# Altium footprint library 接插件.PcbLib: 88 footprints (part 1 of 6)
Each footprint in its own frame and in the unit in brackets; x right, y up, seen from the top. Pads: shape width x height; smd on the part's side, far side on the other; paste and mask are expansions set on the pad; w line width, h text height; cw(c..) or ccw(c..) is an arc to the next point about the centre after c.
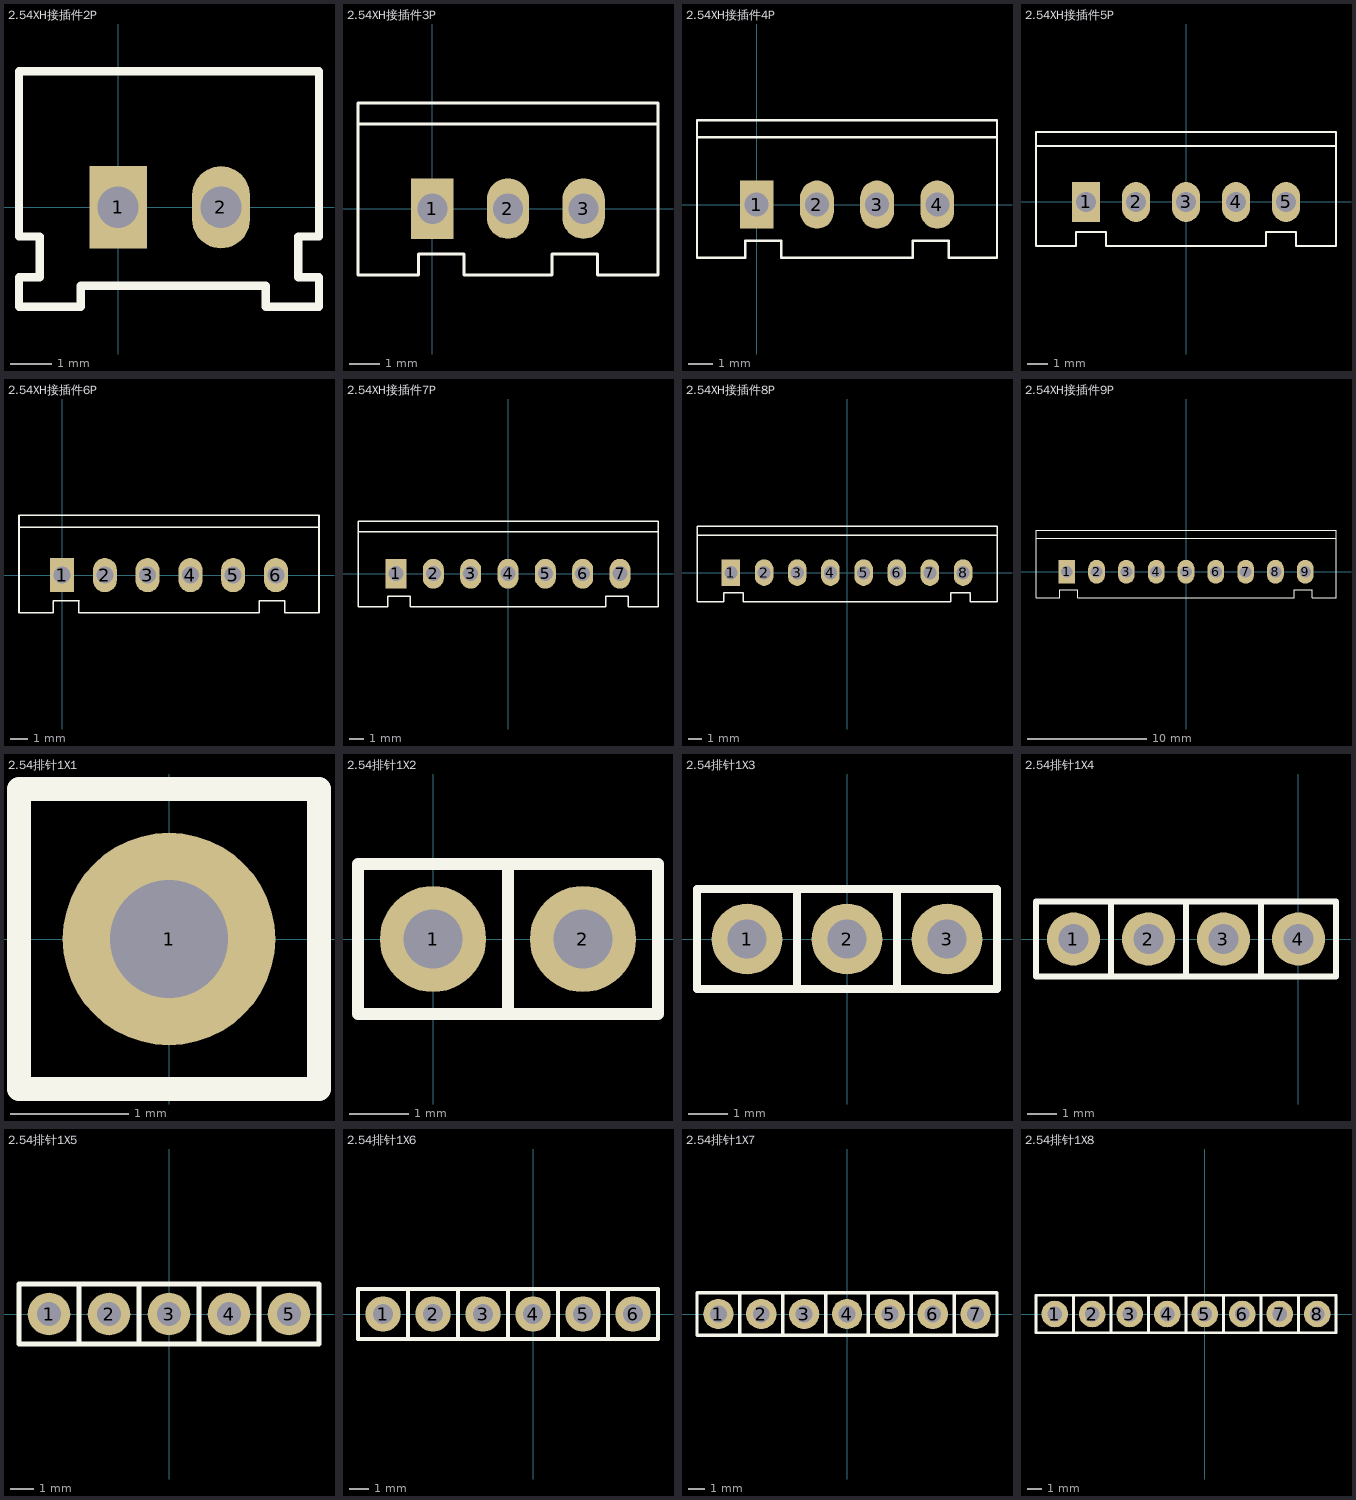
[diagram p0: the footprints below, top view; thin cyan lines are the x and y axes]

## 2.54XH接插件2P [mm]
pads (2):
  rect 1.4x2 hole 1: 1(0,0)
  oval 1.4x2 hole 1: 2(2.5,0)
Top Overlay:
  lines w0.203: -2.408,-2.413 -2.408,-1.702 -1.9,-1.702 -1.9,-0.711 -2.408,-0.711 -2.408,3.302 4.882,3.302 4.882,1.6 4.882,-0.711 4.374,-0.711 4.374,-1.702 4.882,-1.702 4.882,-2.413 3.587,-2.413 3.587,-1.905 -0.909,-1.905 -0.909,-2.413 -2.408,-2.413
3D body "User Library-PW10-02-M green.step": height 7, standoff -3.3, extent -2.513,-2.296 4.987,3.404

## 2.54XH接插件3P [mm]
pads (3):
  rect 1.4x2 hole 1: 1(0,0)
  oval 1.4x2 hole 1: 2(2.5,0) 3(5,0)
Top Overlay:
  lines w0.1: -2.46,2.8 7.46,2.8 ; -2.46,-2.2 -0.46,-2.2 -0.46,-1.5 1.04,-1.5 1.04,-2.2 3.96,-2.2 3.96,-1.5 5.46,-1.5 5.46,-2.2 7.46,-2.2 7.46,3.5 -2.46,3.5 -2.46,-2.2
3D body "User Library-CWF-3.step": height 7, standoff -3.5, extent -2.5,-2.25 7.5,3.45

## 2.54XH接插件4P [mm]
pads (4):
  rect 1.4x2 hole 1: 1(0,0)
  oval 1.4x2 hole 1: 2(2.5,0) 3(5,0) 4(7.5,0)
Top Overlay:
  lines w0.1: -2.48,2.8 9.976,2.8 ; -2.48,-2.2 -2.48,3.5 9.98,3.5 9.98,-2.2 7.98,-2.2 7.98,-1.5 6.48,-1.5 6.48,-2.2 1.02,-2.2 1.02,-1.5 -0.48,-1.5 -0.48,-2.2 -2.48,-2.2
3D body "User Library-CWF-4.step": height 7, standoff -3.5, extent -2.5,-2.25 10,3.45

## 2.54XH接插件5P [mm]
pads (5):
  rect 1.4x2 hole 1: 1(-5,0)
  oval 1.4x2 hole 1: 2(-2.5,0) 3(0,0) 4(2.5,0) 5(5,0)
Top Overlay:
  lines w0.1: -7.5,2.8 7.492,2.8 ; -7.5,-2.2 -7.5,3.5 7.5,3.5 7.5,-2.2 5.5,-2.2 5.5,-1.5 4,-1.5 4,-2.2 -4,-2.2 -4,-1.5 -5.5,-1.5 -5.5,-2.2 -7.5,-2.2
3D body "User Library-CWF-5.step": height 7, standoff -3.5, extent -7.5,-2.25 7.5,3.45

## 2.54XH接插件6P [mm]
pads (6):
  rect 1.4x2 hole 1: 1(0,0)
  oval 1.4x2 hole 1: 2(2.5,0) 3(5,0) 4(7.5,0) 5(10,0) 6(12.5,0)
Top Overlay:
  lines w0.1: -2.52,2.8 15.001,2.8 ; -0.52,-1.5 -0.52,-2.2 -2.52,-2.2 -2.52,3.5 15.02,3.5 15.02,-2.2 13.02,-2.2 13.02,-1.5 11.52,-1.5 11.52,-2.2 0.98,-2.2 0.98,-1.5 ; -0.5,-1.5 1,-1.5
3D body "User Library-CWF-6.step": height 7, standoff -3.5, extent -2.5,-2.25 15,3.45

## 2.54XH接插件7P [mm]
pads (7):
  rect 1.4x2 hole 1: 1(-7.5,0)
  oval 1.4x2 hole 1: 2(-5,0) 3(-2.5,0) 4(0,0) 5(2.5,0) 6(5,0) 7(7.5,0)
Top Overlay:
  lines w0.1: -10.04,2.8 10.036,2.8 ; -10.04,-2.2 -8.04,-2.2 -8.04,-1.5 -6.54,-1.5 -6.54,-2.2 6.54,-2.2 6.54,-1.5 8.04,-1.5 8.04,-2.2 10.04,-2.2 10.04,3.5 -10.04,3.5 -10.04,-2.2
3D body "User Library-CWF-7.step": height 7, standoff -3.5, extent -10,-2.25 10,3.45

## 2.54XH接插件8P [mm]
pads (8):
  rect 1.4x2 hole 1: 1(-8.75,0)
  oval 1.4x2 hole 1: 2(-6.25,0) 3(-3.75,0) 4(-1.25,0) 5(1.25,0) 6(3.75,0) 7(6.25,0) 8(8.75,0)
Top Overlay:
  lines w0.1: -11.31,2.8 11.298,2.8 ; -11.31,-2.2 -11.31,3.5 11.31,3.5 11.31,-2.2 9.31,-2.2 9.31,-1.5 7.81,-1.5 7.81,-2.2 -7.81,-2.2 -7.81,-1.5 -9.31,-1.5 -9.31,-2.2 -11.31,-2.2
3D body "User Library-CWF-8.step": height 7, standoff -3.5, extent -11.25,-2.25 11.25,3.45

## 2.54XH接插件9P [mm]
pads (9):
  rect 1.4x2 hole 1: 1(-10,0)
  oval 1.4x2 hole 1: 2(-7.5,0) 3(-5,0) 4(-2.5,0) 5(0,0) 6(2.5,0) 7(5,0) 8(7.5,0) 9(10,0)
Top Overlay:
  lines w0.1: -12.58,2.8 12.571,2.8 ; -12.58,-2.2 -10.58,-2.2 -10.58,-1.5 -9.08,-1.5 -9.08,-2.2 9.08,-2.2 9.08,-1.5 10.58,-1.5 10.58,-2.2 12.58,-2.2 12.58,3.5 -12.58,3.5 -12.58,-2.2
3D body "User Library-CWF-9.step": height 7, standoff -3.5, extent -12.5,-2.25 12.5,3.45

## 2.54排针1X1 [mm]
pads (1):
  round 1.8 hole 1: 1(0,0)
Top Overlay:
  lines w0.2: -1.27,-1.27 1.27,-1.27 1.27,1.27 -1.27,1.27 -1.27,-1.27
3D body "1001-1.STEP": height 2.5, standoff -9.04, extent -1.27,-1.27 1.27,1.27

## 2.54排针1X2 [mm]
pads (2):
  round 1.8 hole 1: 1(0,0) 2(2.54,0)
Top Overlay:
  lines w0.2: 1.27,-1.27 1.27,1.27 ; -1.27,-1.27 3.81,-1.27 3.81,1.27 -1.27,1.27 -1.27,-1.27
3D body "1001-2.STEP": height 8.54, standoff -3, extent -1.27,-1.27 3.81,1.27

## 2.54排针1X3 [mm]
pads (3):
  round 1.8 hole 1: 1(-2.54,0) 2(0,0) 3(2.54,0)
Top Overlay:
  lines w0.2: -1.27,-1.27 -1.27,1.27 ; 1.27,-1.27 1.27,1.27 ; -3.81,-1.27 3.81,-1.27 3.81,1.27 -3.81,1.27 -3.81,-1.27
3D body "1001-3.STEP": height 2.5, standoff -9.04, extent -3.81,-1.27 3.81,1.27

## 2.54排针1X4 [mm]
pads (4):
  round 1.8 hole 1: 1(-7.62,0) 2(-5.08,0) 3(-2.54,0) 4(0,0)
Top Overlay:
  lines w0.2: -6.35,-1.27 -6.35,1.27 ; -3.81,-1.27 -3.81,1.27 ; -1.27,-1.27 -1.27,1.27 ; -8.89,-1.27 1.27,-1.27 1.27,1.27 -8.89,1.27 -8.89,-1.27
3D body "1001-4.STEP": height 2.5, standoff -9.04, extent -8.89,-1.27 1.27,1.27

## 2.54排针1X5 [mm]
pads (5):
  round 1.8 hole 1: 1(-5.08,0) 2(-2.54,0) 3(0,0) 4(2.54,0) 5(5.08,0)
Top Overlay:
  lines w0.2: -3.81,-1.27 -3.81,1.27 ; -1.27,-1.27 -1.27,1.27 ; 1.27,-1.27 1.27,1.27 ; 3.81,-1.27 3.81,1.27 ; -6.35,-1.27 6.35,-1.27 6.35,1.27 -6.35,1.27 -6.35,-1.27
3D body "1001-5.STEP": height 2.5, standoff -9.04, extent -6.35,-1.27 6.35,1.27

## 2.54排针1X6 [mm]
pads (6):
  round 1.8 hole 1: 1(-7.62,0) 2(-5.08,0) 3(-2.54,0) 4(0,0) 5(2.54,0) 6(5.08,0)
Top Overlay:
  lines w0.2: -6.35,-1.27 -6.35,1.27 ; -3.81,-1.27 -3.81,1.27 ; -1.27,-1.27 -1.27,1.27 ; 1.27,-1.27 1.27,1.27 ; 3.81,-1.27 3.81,1.27 ; -8.89,-1.27 -8.89,1.27 6.35,1.27 6.35,-1.27 -8.89,-1.27
3D body "1001-6.STEP": height 2.5, standoff -9.04, extent -8.89,-1.27 6.35,1.27

## 2.54排针1X7 [mm]
pads (7):
  round 1.8 hole 1: 1(-7.62,0) 2(-5.08,0) 3(-2.54,0) 4(0,0) 5(2.54,0) 6(5.08,0) 7(7.62,0)
Top Overlay:
  lines w0.2: -6.35,-1.27 -6.35,1.27 ; -3.81,-1.27 -3.81,1.27 ; -1.27,-1.27 -1.27,1.27 ; 1.27,-1.27 1.27,1.27 ; 3.81,-1.27 3.81,1.27 ; 6.35,-1.27 6.35,1.27 ; -8.89,-1.27 8.89,-1.27 8.89,1.27 -8.89,1.27 -8.89,-1.27
3D body "1001-7.STEP": height 2.5, standoff -9.04, extent -8.89,-1.27 8.89,1.27

## 2.54排针1X8 [mm]
pads (8):
  round 1.8 hole 1: 1(-10.16,0) 2(-7.62,0) 3(-5.08,0) 4(-2.54,0) 5(0,0) 6(2.54,0) 7(5.08,0) 8(7.62,0)
Top Overlay:
  lines w0.2: -8.89,-1.27 -8.89,1.27 ; -6.35,-1.27 -6.35,1.27 ; -3.81,-1.27 -3.81,1.27 ; -1.27,-1.27 -1.27,1.27 ; 1.27,-1.27 1.27,1.27 ; 3.81,-1.27 3.81,1.27 ; 6.35,-1.27 6.35,1.27 ; -11.43,-1.27 -11.43,1.27 8.89,1.27 8.89,-1.27 -11.43,-1.27
3D body "1001-8.STEP": height 2.5, standoff -9.04, extent -11.43,-1.27 8.89,1.27